# Altium integrated library My_Intlib.IntLib: 86 symbols
Pins are listed as number, name and electrical type; pins without a type are passive.

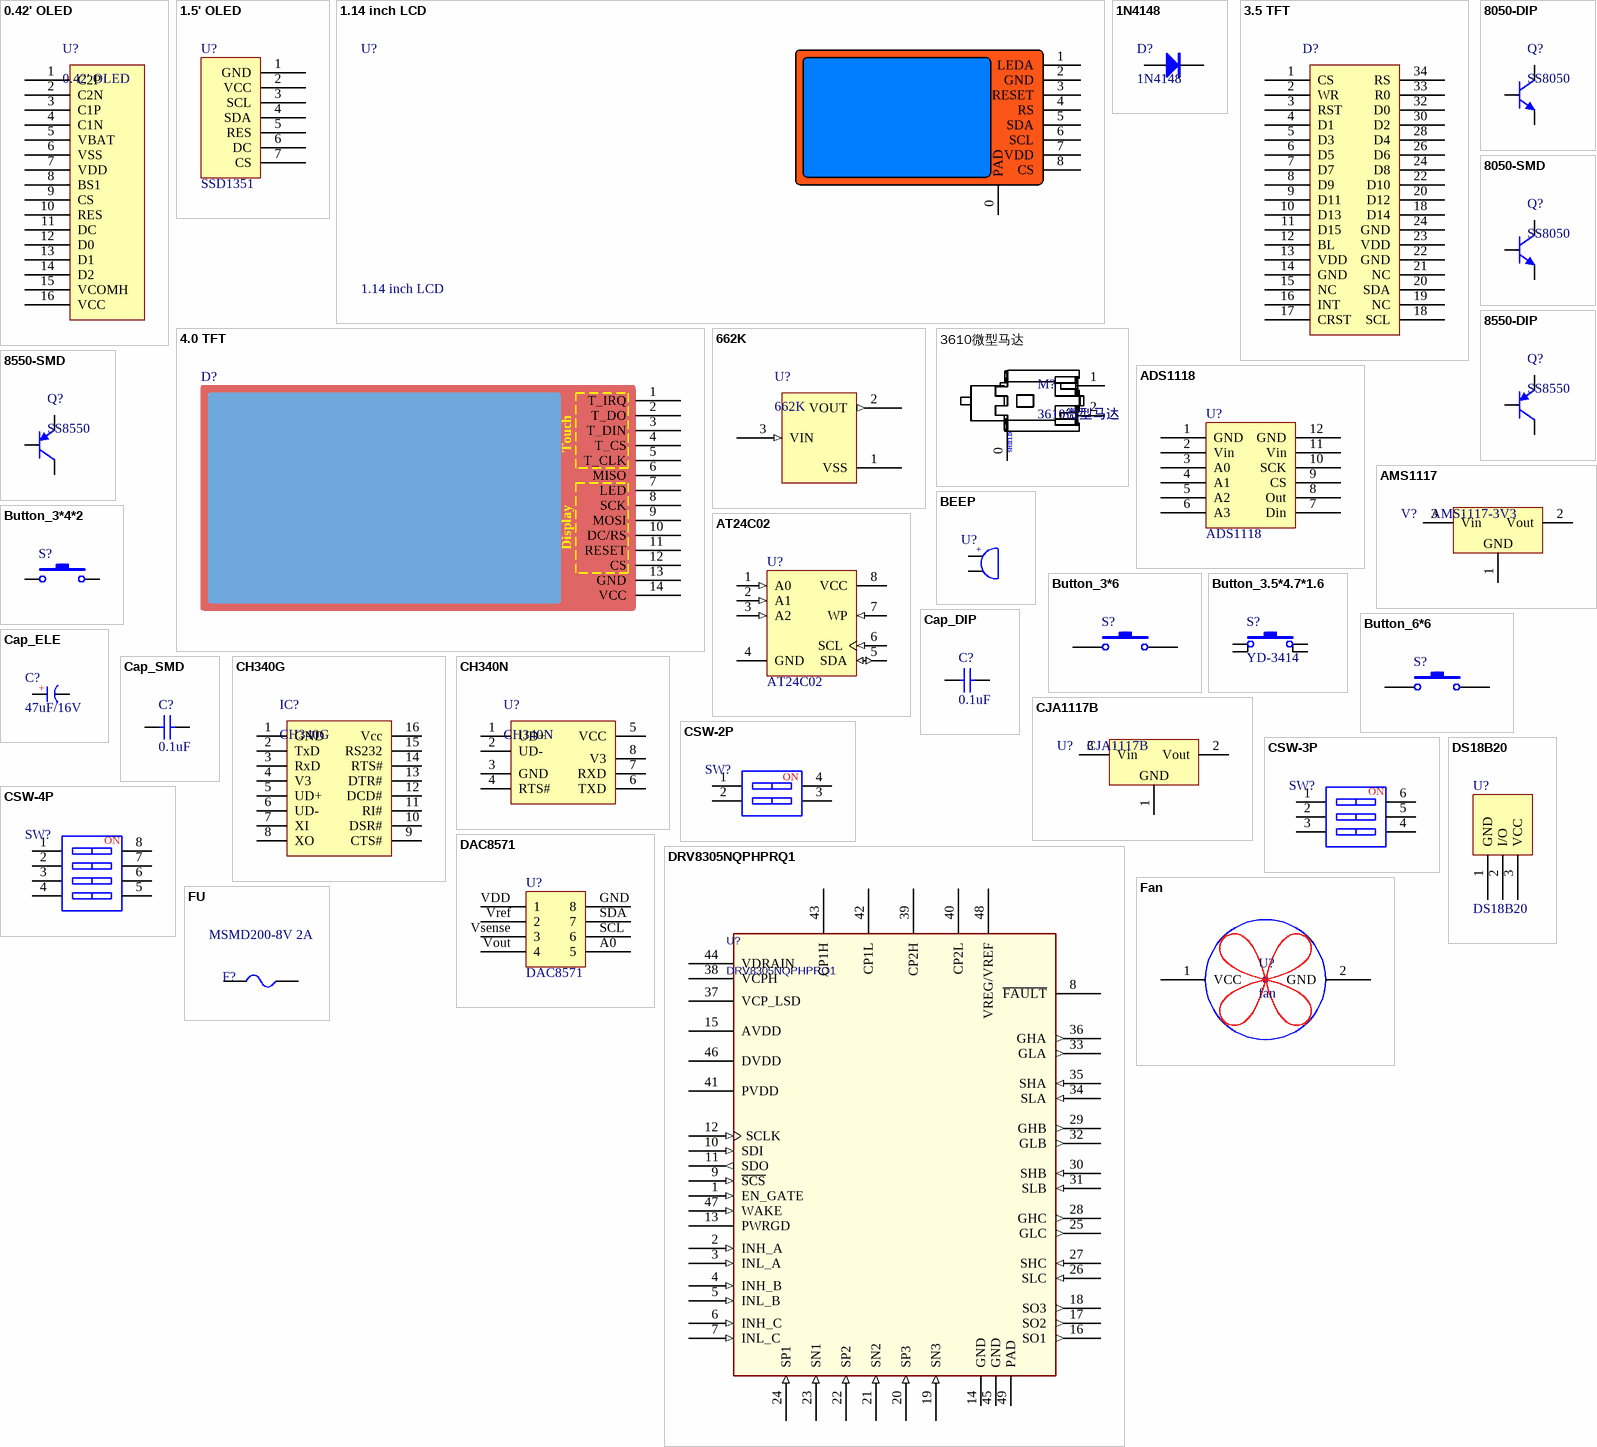
[diagram p0: symbols 0.42' OLED to FU]

## 0.42' OLED
designator U?
0.42寸OLED显示屏 / 驱动芯片SSD1306
footprint OLED 0.42'
pins: 1 C2P, 2 C2N, 3 C1P, 4 C1N, 5 VBAT, 6 VSS, 7 VDD, 8 BS1, 9 CS, 10 RES, 11 DC, 12 D0, 13 D1, 14 D2, 15 VCOMH, 16 VCC

## 1.5' OLED
designator U?, comment SSD1351
1.5寸彩色OLED，SSD1351
footprint OLED 1.3-12864_7pin (长：35.4mm，宽：33.5mm，)
pins: 1 GND, 2 VCC, 3 SCL, 4 SDA, 5 RES, 6 DC, 7 CS

## 1.14 inch LCD
designator U?
1.14寸lcd 液晶屏 显示屏tft lcd彩色液晶高清ips st7789 135x240
footprint 1.14_LCD
pins: 0 PAD, 1 LEDA, 2 GND, 3 RESET, 4 RS, 5 SDA, 6 SCL, 7 VDD, 8 CS

## 1N4148
designator D?
高速开关二极管; 版权归属: 源创客; BOM名称: 高速开关二极管; 学习资源: www.ooocke.com
footprint DO-35 (1.8*6.8mm(直径，脚距）)
footprint MINI_MELF (LL34) (1.5*3.4mm(直径，脚距）)
footprint SOD-323 (1.8x1.3X0.9mm（长宽高，不包括引脚）)
footprint DO-35V (1.8*2.5mm(直径，脚距）)
pins: 1 A, 2 K

## 3.5 TFT
designator D?  (value not drawn)
3.5寸电容触摸屏
pins: 1 CS, 2 WR, 3 RST, 4 D1, 5 D3, 6 D5, 7 D7, 8 D9, 9 D11, 10 D13, 11 D15, 12 BL, 13 VDD, 14 GND, 15 NC, 16 INT, 17 CRST, 18 D14, 18 SCL, 19 NC, 20 D12, 20 SDA, 21 NC, 22 D10, 22 GND, 23 VDD, 24 D8, 24 GND, 26 D6, 28 D4, 30 D2, 32 D0, 33 R0, 34 RS

## 4.0 TFT
designator D?
4.0寸TFT 彩色电阻屏 480*320
footprint 4.0 TFT
pins: 1 T_IRQ, 2 T_DO, 3 T_DIN, 4 T_CS, 5 T_CLK, 6 MISO, 7 LED, 8 SCK, 9 MOSI, 10 DC/RS, 11 RESET, 12 CS, 13 GND, 14 VCC
text: Touch; Display

## 662K
designator U?
线性LDO三极管稳压器芯片XC6206P332MR / 印字662K 封装SOT23
footprint SOT23-3N (3x1.3x1mm(长宽高))
pins: 1 VSS, 2 VOUT (out), 3 VIN (in)

## 3610微型马达
designator M?
3610微型马达，10.6mm*4.4mm*3.5mm，2.3~4.5V，85mA，12000RPM
footprint 3610微型马达 (3610微型马达，10.6mm*4.4mm*3.5mm)
pins: 0 SHIELD, 1, 2

## 8050-DIP
designator Q?, comment SS8050
高频放大-NPN型; 版权归属: 源创客; 属性: 40V 1.5A 1W 100MHZ; BOM名称: 高频放大-NPN型; 学习资源: www.ooocke.com
footprint TO92A (92晶体管)
footprint TO92B (92晶体管)
pins: 1 E, 2 B, 3 C

## 8050-SMD
designator Q?, comment SS8050
高频放大-NPN型; 版权归属: 源创客; 属性: 40V 1.5A 1W 100MHZ; BOM名称: 高频放大-NPN型; 学习资源: www.ooocke.com
footprint SOT23-3N (3x1.3x1mm(长宽高))
pins: 1 B, 2 E, 3 C

## 8550-DIP
designator Q?, comment SS8550
高频放大-PNP型; 版权归属: 源创客; 属性: 40V 1.5A 1W 100MHZ; BOM名称: 高频放大-PNP型; 学习资源: www.ooocke.com
footprint TO92A (92晶体管)
footprint TO92B (92晶体管)
pins: 1 E, 2 B, 3 C

## 8550-SMD
designator Q?, comment SS8550
高频放大-PNP型; 版权归属: 源创客; 属性: 40V 1.5A 1W 100MHZ; BOM名称: 高频放大-PNP型; 学习资源: www.ooocke.com
footprint SOT23-3N (3x1.3x1mm(长宽高))
pins: 1 B, 2 E, 3 C

## ADS1118
designator U?
16位ADC芯片
footprint ADS1118
pins: 1 GND, 2 Vin, 3 A0, 4 A1, 5 A2, 6 A3, 7 Din, 8 Out, 9 CS, 10 SCK, 11 Vin, 12 GND

## AMS1117
designator V?, comment AMS1117-3V3
三端稳压芯片; BOM名称: 稳压芯片; 版权归属: 源创客; 学习资源: www.ooocke.com
footprint SOT223 (6.4x7x1.6mm(长宽高))
pins: 1 GND, 2 Vout, 3 Vin

## AT24C02
designator U?
256KB，I2C通信; Published: 20-Sep-2010; DatasheetVersion: 8517C,  Jan-2009; PackageVersion: revC, Mar-2005; PackageReference: 8S1; Publisher: Altium Limited; PackageDescription: 8-Lead (0.150" Wide Body), Plastic Gull Wing Small Outline (JEDEC SOIC); Code_JEDEC: MS-012-AA; Code_IPC: SOIC127P600-8; ComponentLink1Description: Manufacturer Link; ComponentLink1URL: http://www.atmel.com/products/serial/default.asp; ComponentLink2Description: Datasheet; ComponentLink2URL: http://www.atmel.com/dyn/resources/prod_documents/doc8517.pdf; ComponentLink3Description: Atmel.com Home; ComponentLink3URL: http://www.atmel.com
footprint DIP8-300_MH (带底座 9.4*7.6*3.8(长宽高）)
footprint SOP8_N (5*6*1.8mm（长宽高）)
pins: 1 A0 (in), 2 A1 (in), 3 A2 (in), 4 GND (power), 5 SDA (io), 6 SCL (in), 7 WP (in), 8 VCC (power)

## BEEP
designator U?
蜂鸣器5020; BOM名称: 蜂鸣器; 版权归属: 源创客; 学习资源: www.ooocke.com
footprint Bee_5020
pins: 1, 2
text: +

## Button_3*4*2
designator S?
Published: 24-Mar-1999; LatestRevisionDate: 17-Jul-2002; LatestRevisionNote: Re-released for DXP Platform.; PackageReference: SPST-2; Publisher: Altium Limited
footprint TSW SMD-3*4*2
pins: 1, 2

## Button_3*6
designator S?
3mm*4mm*按钮长度待定; Published: 24-Mar-1999; LatestRevisionDate: 17-Jul-2002; LatestRevisionNote: Re-released for DXP Platform.; PackageReference: SPST-2; Publisher: Altium Limited
footprint TSW SMD-3*6*4.3
footprint TSW DIP-3*6*4.3_V (侧按轻触开关 3*6*4.3mm)
footprint TSW DIP-3*6*5 (3*6*5mm)
footprint TSW DIP-3*6*5_V (侧按轻触开关 3*6*5mm)
footprint TSW DIP-3*6*4.3 (3*6*4.3mm)
footprint TSW SMD-3*6*5 (3*6*5mm)
footprint TSW SMD-3*6*4.3_V (侧立贴片3*6*4.3)
pins: 1, 2

## Button_3.5*4.7*1.6
designator S?, comment YD-3414
中龟按键3.5*4.7*1.6; Published: 24-Mar-1999; LatestRevisionDate: 17-Jul-2002; LatestRevisionNote: Re-released for DXP Platform.; PackageReference: SPST-2; Publisher: Altium Limited
footprint YD3414 (中龟按键3.5*4.7*1.6)
pins: 1, 2, 3, 4

## Button_6*6
designator S?
6mm*6mm*按钮长度待定; Published: 24-Mar-1999; LatestRevisionDate: 17-Jul-2002; LatestRevisionNote: Re-released for DXP Platform.; PackageReference: SPST-2; Publisher: Altium Limited
footprint TSW DIP-6*6*4.3 (6*6*4.3mm)
footprint TSW DIP-6*6*4.3_V (侧按轻触开关 6*6*4.3mm)
footprint TSW DIP-6*6*5 (6*6*5mm)
footprint TSW DIP-6*6*5_V (侧按轻触开关 6*6*5mm)
footprint TSW DIP-6*6*6 (6*6*6mm)
footprint TSW DIP-6*6*6_V (侧按轻触开关 6*6*6mm)
footprint TSW DIP-6*6*7 (6*6*7mm)
footprint TSW DIP-6*6*7_V (侧按轻触开关 6*6*7mm)
footprint TSW SMD-6*6*4.3 (6*6*4.3mm)
footprint TSW SMD-6*6*5 (6*6*5mm)
footprint TSW SMD-6*6*6 (6*6*6mm)
footprint TSW SMD-6*6*7 (6*6*7mm)
pins: 1, 2

## Cap_DIP
designator C?, comment 0.1uF
直插电容; Value: 100nF; Voltage: 63V; Published: 8-Jun-2000; Revision: July-2002: Re-released for DXP Platform.; Publisher: Altium Limited; 实物样品照片: https://item.taobao.com/item.htm?spm=a230r.1.14.32.21fd24b7VWml4d&id=37914290992&ns=1&abbucket=13#detail
footprint 瓷片电容 (脚距2.2mm直径5mm)
pins: 1, 2

## Cap_ELE
designator C?, comment 47uF/16V
电解电容
footprint CM C(5*5.4) (贴片电解电容，直径5mm，高5.4mm)
pins: 1 A, 2 K
text: +

## Cap_SMD
designator C?, comment 0.1uF
贴片电容; Value: 100nF; Voltage: 63V; Published: 8-Jun-2000; Revision: July-2002: Re-released for DXP Platform.; Publisher: Altium Limited; 实物样品照片: https://item.taobao.com/item.htm?spm=a230r.1.14.32.21fd24b7VWml4d&id=37914290992&ns=1&abbucket=13#detail
footprint 0805_C
pins: 1, 2

## CH340G
designator IC?
串口转USB; 版权归属: 源创客; BOM名称: 串口转USB; 学习资源: www.ooocke.com
footprint SOP16_N (10.3*6.2*1.8mm（长宽高）)
pins: 1 GND, 2 TxD, 3 RxD, 4 V3, 5 UD+, 6 UD-, 7 XI, 8 XO, 9 CTS#, 10 DSR#, 11 RI#, 12 DCD#, 13 DTR#, 14 RTS#, 15 RS232, 16 Vcc

## CH340N
designator U?
串口转USB，内置时钟; BOM名称: 串口转USB; 版权归属: 源创客; 学习资源: www.ooocke.com
footprint SOP8_N (5*6*1.8mm（长宽高）)
pins: 1 UD+, 2 UD-, 3 GND, 4 RTS#, 5 VCC, 6 TXD, 7 RXD, 8 V3

## CJA1117B
designator U?
三端稳压芯片; BOM名称: 稳压芯片; 版权归属: 源创客; 学习资源: www.ooocke.com
footprint SOT89_N (CJA1117_4.6x4.3x1.6mm(长宽高))
pins: 1 GND, 2 Vout, 3 Vin

## CSW-2P
designator SW?  (value not drawn)
2路编码开关; 版权归属: 源创客; BOM名称: 2路编码开关; 学习资源: www.ooocke.com
footprint CSW DIP-2P (6.6*9.9*7mm)
footprint CSW DIP-2P_G (6.6*9.9*7mm)
footprint CSW1.27 SMD-2P (长：4.14mm，宽：5.4mm，高：2.3mm)
pins: 1, 2, 3, 4
text: ON

## CSW-3P
designator SW?  (value not drawn)
3路编码开关; 版权归属: 源创客; BOM名称: 3路编码开关; 学习资源: www.ooocke.com
footprint CSW DIP-3P (9.2*9.9*7mm)
footprint CSW DIP-3P_G (9.2*9.9*7mm)
footprint CSW1.27 SMD-3P (长：5.41mm，宽：5.4mm，高：2.3mm)
pins: 1, 2, 3, 4, 5, 6
text: ON

## CSW-4P
designator SW?  (value not drawn)
4路编码开关; 版权归属: 源创客; BOM名称: 4路编码开关; 学习资源: www.ooocke.com
footprint CSW DIP-4P (11.7*9.9*7mm)
footprint CSW DIP-4P_G (11.7*9.9*7mm)
footprint CSW1.27 SMD-4P (长：6.68mm，宽：5.4mm，高：2.3mm)
pins: 1, 2, 3, 4, 5, 6, 7, 8
text: ON

## DAC8571
designator U?
16位DAC芯片
footprint DIP8-300_MH (带底座 9.4*7.6*3.8(长宽高）); pin to pad A0>5 GND>8 SCL>6 SDA>7 VDD>1 Vout>4 Vref>2 Vsense>3
pins: A0 5, GND 8, SCL 6, SDA 7, VDD 1, Vout 4, Vref 2, Vsense 3

## DRV8305NQPHPRQ1
designator U?
TI的H桥有刷电机驱动 WQFN
footprint LQFP48-0R5-7X7-EP5X5 (TSQFP, 48-Leads, Body 7.00x7.00mm, Pitch 0.50mm, IPC Medium Density)
pins: 1 EN_GATE (in), 2 INH_A (in), 3 INL_A (in), 4 INH_B (in), 5 INL_B (in), 6 INH_C (in), 7 INL_C (in), 8 ~{FAULT} (oc), 9 ~{SCS} (in), 10 SDI (in), 11 SDO (out), 12 SCLK (in), 13 PWRGD (oc), 14 GND (power), 15 AVDD (power), 16 SO1 (out), 17 SO2 (out), 18 SO3 (out), 19 SN3 (in), 20 SP3 (in), 21 SN2 (in), 22 SP2 (in), 23 SN1 (in), 24 SP1 (in), 25 GLC (out), 26 SLC (in), 27 SHC (in), 28 GHC (out), 29 GHB (out), 30 SHB (in), 31 SLB (in), 32 GLB (out), 33 GLA (out), 34 SLA (in), 35 SHA (in), 36 GHA (out), 37 VCP_LSD, 38 VCPH, 39 CP2H, 40 CP2L, 41 PVDD (power), 42 CP1L, 43 CP1H, 44 VDRAIN (power), 45 GND (power), 46 DVDD (power), 47 WAKE (in), 48 VREG/VREF (power), 49 PAD (power)

## DS18B20
designator U?
数字型温度传感器
footprint HDR-1X3_Y (圆孔排母，3脚)
pins: 1 GND, 2 I/O, 3 VCC

## Fan
designator U?, comment fan
pins: 1 VCC, 2 GND

## FU
designator F?, comment MSMD200-8V 2A
贴片保险丝; 版权归属: 源创客; BOM名称: 贴片保险丝; 学习资源: www.ooocke.com
footprint FU 1210 (贴片保险丝)
pins: 1, 2

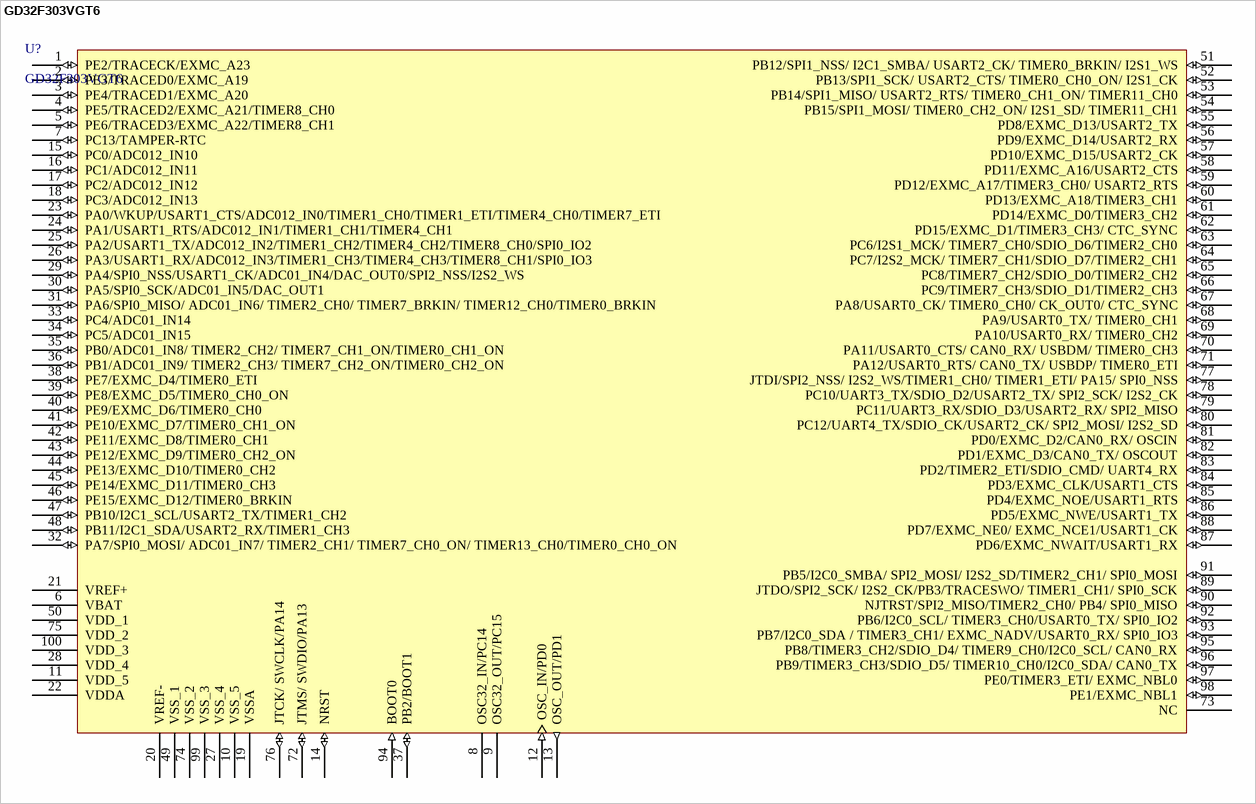
[diagram p1: symbol GD32F303VGT6]

## GD32F303VGT6
designator U?
【Package】：LQFP100     【Max Speed (MHz)】：120     【Flash (Bytes)】：1024K     【SRAM (Bytes)】：96K     【I/O】：up to 80 / 【GPTM (16bit)】：10     【Advanced TM (16bit)】：2     【Basic TM (16bit)】：2     【SysTick (24bit)】：1     【WDG】：2     【RTC】：1 / 【USART+UART】：3+2     【I2C】：2     【SPI】：3     【CAN 2.0B】：1    【USB 2.0】：1_FS     【I2S】：2 / 【SDIO】：1     【EXMC】：1     【12bit ADC Units (CHs)】：3(16)     【12bit DAC Units】：2
footprint LQFP100 14x14_N (100脚，体宽14x14mm，脚距0.5mm)
pins: 1 PE2/TRACECK/EXMC_A23 (io), 2 PE3/TRACED0/EXMC_A19 (io), 3 PE4/TRACED1/EXMC_A20 (io), 4 PE5/TRACED2/EXMC_A21/TIMER8_CH0 (io), 5 PE6/TRACED3/EXMC_A22/TIMER8_CH1 (io), 6 VBAT (power), 7 PC13/TAMPER-RTC (io), 8 OSC32_IN/PC14, 9 OSC32_OUT/PC15, 10 VSS_5 (power), 11 VDD_5 (power), 12 OSC_IN/PD0 (in), 13 OSC_OUT/PD1 (out), 14 NRST (io), 15 PC0/ADC012_IN10 (io), 16 PC1/ADC012_IN11 (io), 17 PC2/ADC012_IN12 (io), 18 PC3/ADC012_IN13 (io), 19 VSSA (power), 20 VREF- (power), 21 VREF+ (power), 22 VDDA (power), 23 PA0/WKUP/USART1_CTS/ADC012_IN0/TIMER1_CH0/TIMER1_ETI/TIMER4_CH0/TIMER7_ETI (io), 24 PA1/USART1_RTS/ADC012_IN1/TIMER1_CH1/TIMER4_CH1 (io), 25 PA2/USART1_TX/ADC012_IN2/TIMER1_CH2/TIMER4_CH2/TIMER8_CH0/SPI0_IO2 (io), 26 PA3/USART1_RX/ADC012_IN3/TIMER1_CH3/TIMER4_CH3/TIMER8_CH1/SPI0_IO3 (io), 27 VSS_4 (power), 28 VDD_4 (power), 29 PA4/SPI0_NSS/USART1_CK/ADC01_IN4/DAC_OUT0/SPI2_NSS/I2S2_WS (io), 30 PA5/SPI0_SCK/ADC01_IN5/DAC_OUT1 (io), 31 PA6/SPI0_MISO/ ADC01_IN6/ TIMER2_CH0/ TIMER7_BRKIN/ TIMER12_CH0/TIMER0_BRKIN (io), 32 PA7/SPI0_MOSI/ ADC01_IN7/ TIMER2_CH1/ TIMER7_CH0_ON/ TIMER13_CH0/TIMER0_CH0_ON (io), 33 PC4/ADC01_IN14 (io), 34 PC5/ADC01_IN15 (io), 35 PB0/ADC01_IN8/ TIMER2_CH2/ TIMER7_CH1_ON/TIMER0_CH1_ON (io), 36 PB1/ADC01_IN9/ TIMER2_CH3/ TIMER7_CH2_ON/TIMER0_CH2_ON (io), 37 PB2/BOOT1 (io), 38 PE7/EXMC_D4/TIMER0_ETI (io), 39 PE8/EXMC_D5/TIMER0_CH0_ON (io), 40 PE9/EXMC_D6/TIMER0_CH0 (io), 41 PE10/EXMC_D7/TIMER0_CH1_ON (io), 42 PE11/EXMC_D8/TIMER0_CH1 (io), 43 PE12/EXMC_D9/TIMER0_CH2_ON (io), 44 PE13/EXMC_D10/TIMER0_CH2 (io), 45 PE14/EXMC_D11/TIMER0_CH3 (io), 46 PE15/EXMC_D12/TIMER0_BRKIN (io), 47 PB10/I2C1_SCL/USART2_TX/TIMER1_CH2 (io), 48 PB11/I2C1_SDA/USART2_RX/TIMER1_CH3 (io), 49 VSS_1 (power), 50 VDD_1 (power), 51 PB12/SPI1_NSS/ I2C1_SMBA/ USART2_CK/ TIMER0_BRKIN/ I2S1_WS (io), 52 PB13/SPI1_SCK/ USART2_CTS/ TIMER0_CH0_ON/ I2S1_CK (io), 53 PB14/SPI1_MISO/ USART2_RTS/ TIMER0_CH1_ON/ TIMER11_CH0 (io), 54 PB15/SPI1_MOSI/ TIMER0_CH2_ON/ I2S1_SD/ TIMER11_CH1 (io), 55 PD8/EXMC_D13/USART2_TX (io), 56 PD9/EXMC_D14/USART2_RX (io), 57 PD10/EXMC_D15/USART2_CK (io), 58 PD11/EXMC_A16/USART2_CTS (io), 59 PD12/EXMC_A17/TIMER3_CH0/ USART2_RTS (io), 60 PD13/EXMC_A18/TIMER3_CH1 (io), 61 PD14/EXMC_D0/TIMER3_CH2 (io), 62 PD15/EXMC_D1/TIMER3_CH3/ CTC_SYNC (io), 63 PC6/I2S1_MCK/ TIMER7_CH0/SDIO_D6/TIMER2_CH0 (io), 64 PC7/I2S2_MCK/ TIMER7_CH1/SDIO_D7/TIMER2_CH1 (io), 65 PC8/TIMER7_CH2/SDIO_D0/TIMER2_CH2 (io), 66 PC9/TIMER7_CH3/SDIO_D1/TIMER2_CH3 (io), 67 PA8/USART0_CK/ TIMER0_CH0/ CK_OUT0/ CTC_SYNC (io), 68 PA9/USART0_TX/ TIMER0_CH1 (io), 69 PA10/USART0_RX/ TIMER0_CH2 (io), 70 PA11/USART0_CTS/ CAN0_RX/ USBDM/ TIMER0_CH3 (io), 71 PA12/USART0_RTS/ CAN0_TX/ USBDP/ TIMER0_ETI (io), 72 JTMS/ SWDIO/PA13 (io), 73 NC (hiz), 74 VSS_2 (power), 75 VDD_2 (power), 76 JTCK/ SWCLK/PA14 (io), 77 JTDI/SPI2_NSS/ I2S2_WS/TIMER1_CH0/ TIMER1_ETI/ PA15/ SPI0_NSS (io), 78 PC10/UART3_TX/SDIO_D2/USART2_TX/ SPI2_SCK/ I2S2_CK (io), 79 PC11/UART3_RX/SDIO_D3/USART2_RX/ SPI2_MISO (io), 80 PC12/UART4_TX/SDIO_CK/USART2_CK/ SPI2_MOSI/ I2S2_SD (io), 81 PD0/EXMC_D2/CAN0_RX/ OSCIN (io), 82 PD1/EXMC_D3/CAN0_TX/ OSCOUT (io), 83 PD2/TIMER2_ETI/SDIO_CMD/ UART4_RX (io), 84 PD3/EXMC_CLK/USART1_CTS (io), 85 PD4/EXMC_NOE/USART1_RTS (io), 86 PD5/EXMC_NWE/USART1_TX (io), 87 PD6/EXMC_NWAIT/USART1_RX (io), 88 PD7/EXMC_NE0/ EXMC_NCE1/USART1_CK (io), 89 JTDO/SPI2_SCK/ I2S2_CK/PB3/TRACESWO/ TIMER1_CH1/ SPI0_SCK (io), 90 NJTRST/SPI2_MISO/TIMER2_CH0/ PB4/ SPI0_MISO (io), 91 PB5/I2C0_SMBA/ SPI2_MOSI/ I2S2_SD/TIMER2_CH1/ SPI0_MOSI (io), 92 PB6/I2C0_SCL/ TIMER3_CH0/USART0_TX/ SPI0_IO2 (io), 93 PB7/I2C0_SDA / TIMER3_CH1/ EXMC_NADV/USART0_RX/ SPI0_IO3 (io), 94 BOOT0 (in), 95 PB8/TIMER3_CH2/SDIO_D4/ TIMER9_CH0/I2C0_SCL/ CAN0_RX (io), 96 PB9/TIMER3_CH3/SDIO_D5/ TIMER10_CH0/I2C0_SDA/ CAN0_TX (io), 97 PE0/TIMER3_ETI/ EXMC_NBL0 (io), 98 PE1/EXMC_NBL1 (io), 99 VSS_3 (power), 100 VDD_3 (power)

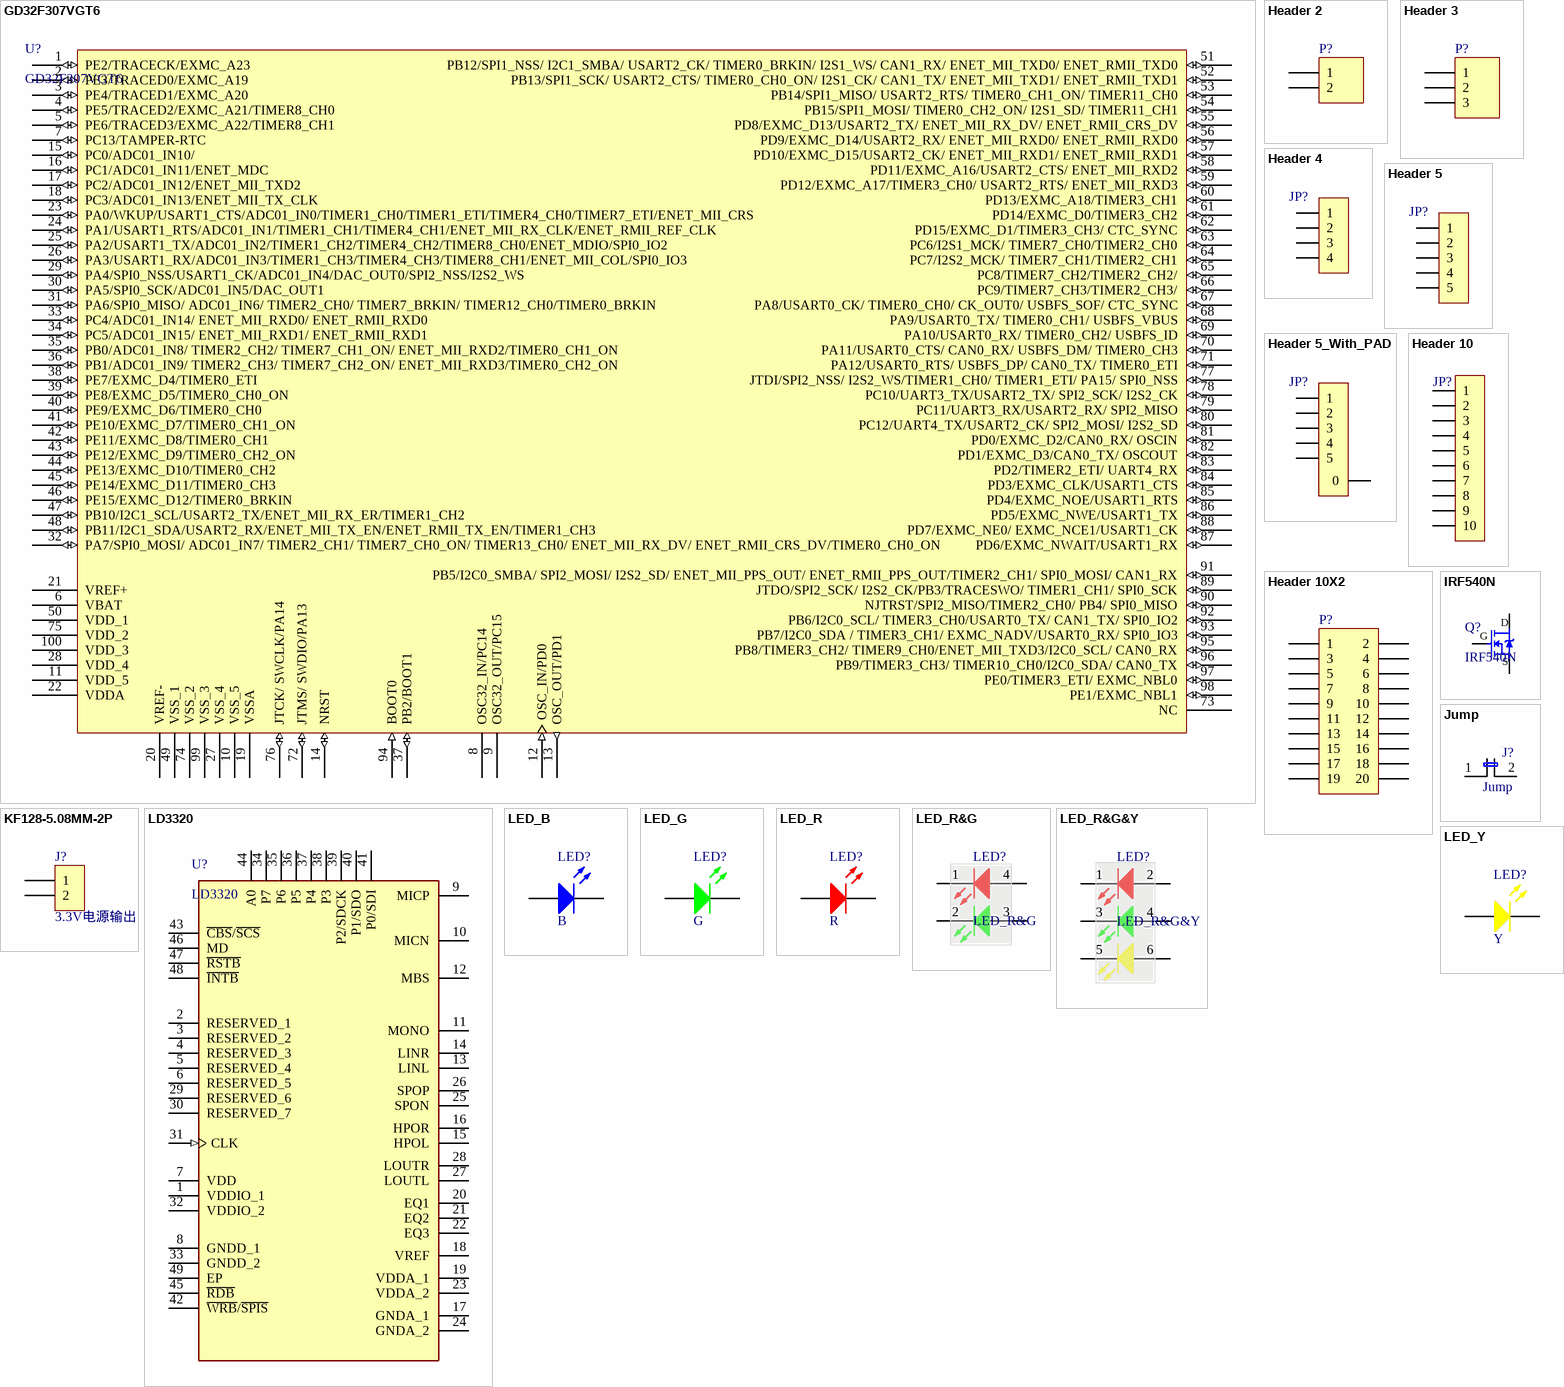
[diagram p2: symbols GD32F307VGT6 to LED_Y]

## GD32F307VGT6
designator U?
【Package】：LQFP100     【Max Speed (MHz)】：120     【Flash (Bytes)】：1024K     【SRAM (Bytes)】：96K     【I/O】：up to 80 / 【GPTM (16bit)】：10     【Advanced TM (16bit)】：2     【Basic TM (16bit)】：2     【SysTick (24bit)】：1     【WDG】：2     【RTC】：1 / 【USART+UART】：3+2     【I2C】：2     【SPI】：3     【CAN 2.0B】：2     【USB 2.0】：FS_OTG     【I2S】：2 / 【Ethernet】：1     【EXMC/SDRAM】：1/0     【12bit ADC Units (CHs)】：2(16)     【12bit DAC Units】：2
footprint LQFP100 14x14_N (100脚，体宽14x14mm，脚距0.5mm)
pins: 1 PE2/TRACECK/EXMC_A23 (io), 2 PE3/TRACED0/EXMC_A19 (io), 3 PE4/TRACED1/EXMC_A20 (io), 4 PE5/TRACED2/EXMC_A21/TIMER8_CH0 (io), 5 PE6/TRACED3/EXMC_A22/TIMER8_CH1 (io), 6 VBAT (power), 7 PC13/TAMPER-RTC (io), 8 OSC32_IN/PC14, 9 OSC32_OUT/PC15, 10 VSS_5 (power), 11 VDD_5 (power), 12 OSC_IN/PD0 (in), 13 OSC_OUT/PD1 (out), 14 NRST (io), 15 PC0/ADC01_IN10/ (io), 16 PC1/ADC01_IN11/ENET_MDC (io), 17 PC2/ADC01_IN12/ENET_MII_TXD2 (io), 18 PC3/ADC01_IN13/ENET_MII_TX_CLK (io), 19 VSSA (power), 20 VREF- (power), 21 VREF+ (power), 22 VDDA (power), 23 PA0/WKUP/USART1_CTS/ADC01_IN0/TIMER1_CH0/TIMER1_ETI/TIMER4_CH0/TIMER7_ETI/ENET_MII_CRS (io), 24 PA1/USART1_RTS/ADC01_IN1/TIMER1_CH1/TIMER4_CH1/ENET_MII_RX_CLK/ENET_RMII_REF_CLK (io), 25 PA2/USART1_TX/ADC01_IN2/TIMER1_CH2/TIMER4_CH2/TIMER8_CH0/ENET_MDIO/SPI0_IO2 (io), 26 PA3/USART1_RX/ADC01_IN3/TIMER1_CH3/TIMER4_CH3/TIMER8_CH1/ENET_MII_COL/SPI0_IO3 (io), 27 VSS_4 (power), 28 VDD_4 (power), 29 PA4/SPI0_NSS/USART1_CK/ADC01_IN4/DAC_OUT0/SPI2_NSS/I2S2_WS (io), 30 PA5/SPI0_SCK/ADC01_IN5/DAC_OUT1 (io), 31 PA6/SPI0_MISO/ ADC01_IN6/ TIMER2_CH0/ TIMER7_BRKIN/ TIMER12_CH0/TIMER0_BRKIN (io), 32 PA7/SPI0_MOSI/ ADC01_IN7/ TIMER2_CH1/ TIMER7_CH0_ON/ TIMER13_CH0/ ENET_MII_RX_DV/ ENET_RMII_CRS_DV/TIMER0_CH0_ON (io), 33 PC4/ADC01_IN14/ ENET_MII_RXD0/ ENET_RMII_RXD0 (io), 34 PC5/ADC01_IN15/ ENET_MII_RXD1/ ENET_RMII_RXD1 (io), 35 PB0/ADC01_IN8/ TIMER2_CH2/ TIMER7_CH1_ON/ ENET_MII_RXD2/TIMER0_CH1_ON (io), 36 PB1/ADC01_IN9/ TIMER2_CH3/ TIMER7_CH2_ON/ ENET_MII_RXD3/TIMER0_CH2_ON (io), 37 PB2/BOOT1 (io), 38 PE7/EXMC_D4/TIMER0_ETI (io), 39 PE8/EXMC_D5/TIMER0_CH0_ON (io), 40 PE9/EXMC_D6/TIMER0_CH0 (io), 41 PE10/EXMC_D7/TIMER0_CH1_ON (io), 42 PE11/EXMC_D8/TIMER0_CH1 (io), 43 PE12/EXMC_D9/TIMER0_CH2_ON (io), 44 PE13/EXMC_D10/TIMER0_CH2 (io), 45 PE14/EXMC_D11/TIMER0_CH3 (io), 46 PE15/EXMC_D12/TIMER0_BRKIN (io), 47 PB10/I2C1_SCL/USART2_TX/ENET_MII_RX_ER/TIMER1_CH2 (io), 48 PB11/I2C1_SDA/USART2_RX/ENET_MII_TX_EN/ENET_RMII_TX_EN/TIMER1_CH3 (io), 49 VSS_1 (power), 50 VDD_1 (power), 51 PB12/SPI1_NSS/ I2C1_SMBA/ USART2_CK/ TIMER0_BRKIN/ I2S1_WS/ CAN1_RX/ ENET_MII_TXD0/ ENET_RMII_TXD0 (io), 52 PB13/SPI1_SCK/ USART2_CTS/ TIMER0_CH0_ON/ I2S1_CK/ CAN1_TX/ ENET_MII_TXD1/ ENET_RMII_TXD1 (io), 53 PB14/SPI1_MISO/ USART2_RTS/ TIMER0_CH1_ON/ TIMER11_CH0 (io), 54 PB15/SPI1_MOSI/ TIMER0_CH2_ON/ I2S1_SD/ TIMER11_CH1 (io), 55 PD8/EXMC_D13/USART2_TX/ ENET_MII_RX_DV/ ENET_RMII_CRS_DV (io), 56 PD9/EXMC_D14/USART2_RX/ ENET_MII_RXD0/ ENET_RMII_RXD0 (io), 57 PD10/EXMC_D15/USART2_CK/ ENET_MII_RXD1/ ENET_RMII_RXD1 (io), 58 PD11/EXMC_A16/USART2_CTS/ ENET_MII_RXD2 (io), 59 PD12/EXMC_A17/TIMER3_CH0/ USART2_RTS/ ENET_MII_RXD3 (io), 60 PD13/EXMC_A18/TIMER3_CH1 (io), 61 PD14/EXMC_D0/TIMER3_CH2 (io), 62 PD15/EXMC_D1/TIMER3_CH3/ CTC_SYNC (io), 63 PC6/I2S1_MCK/ TIMER7_CH0/TIMER2_CH0 (io), 64 PC7/I2S2_MCK/ TIMER7_CH1/TIMER2_CH1 (io), 65 PC8/TIMER7_CH2/TIMER2_CH2/ (io), 66 PC9/TIMER7_CH3/TIMER2_CH3/ (io), 67 PA8/USART0_CK/ TIMER0_CH0/ CK_OUT0/ USBFS_SOF/ CTC_SYNC (io), 68 PA9/USART0_TX/ TIMER0_CH1/ USBFS_VBUS (io), 69 PA10/USART0_RX/ TIMER0_CH2/ USBFS_ID (io), 70 PA11/USART0_CTS/ CAN0_RX/ USBFS_DM/ TIMER0_CH3 (io), 71 PA12/USART0_RTS/ USBFS_DP/ CAN0_TX/ TIMER0_ETI (io), 72 JTMS/ SWDIO/PA13 (io), 73 NC (hiz), 74 VSS_2 (power), 75 VDD_2 (power), 76 JTCK/ SWCLK/PA14 (io), 77 JTDI/SPI2_NSS/ I2S2_WS/TIMER1_CH0/ TIMER1_ETI/ PA15/ SPI0_NSS (io), 78 PC10/UART3_TX/USART2_TX/ SPI2_SCK/ I2S2_CK (io), 79 PC11/UART3_RX/USART2_RX/ SPI2_MISO (io), 80 PC12/UART4_TX/USART2_CK/ SPI2_MOSI/ I2S2_SD (io), 81 PD0/EXMC_D2/CAN0_RX/ OSCIN (io), 82 PD1/EXMC_D3/CAN0_TX/ OSCOUT (io), 83 PD2/TIMER2_ETI/ UART4_RX (io), 84 PD3/EXMC_CLK/USART1_CTS (io), 85 PD4/EXMC_NOE/USART1_RTS (io), 86 PD5/EXMC_NWE/USART1_TX (io), 87 PD6/EXMC_NWAIT/USART1_RX (io), 88 PD7/EXMC_NE0/ EXMC_NCE1/USART1_CK (io), 89 JTDO/SPI2_SCK/ I2S2_CK/PB3/TRACESWO/ TIMER1_CH1/ SPI0_SCK (io), 90 NJTRST/SPI2_MISO/TIMER2_CH0/ PB4/ SPI0_MISO (io), 91 PB5/I2C0_SMBA/ SPI2_MOSI/ I2S2_SD/ ENET_MII_PPS_OUT/ ENET_RMII_PPS_OUT/TIMER2_CH1/ SPI0_MOSI/ CAN1_RX (io), 92 PB6/I2C0_SCL/ TIMER3_CH0/USART0_TX/ CAN1_TX/ SPI0_IO2 (io), 93 PB7/I2C0_SDA / TIMER3_CH1/ EXMC_NADV/USART0_RX/ SPI0_IO3 (io), 94 BOOT0 (in), 95 PB8/TIMER3_CH2/ TIMER9_CH0/ENET_MII_TXD3/I2C0_SCL/ CAN0_RX (io), 96 PB9/TIMER3_CH3/ TIMER10_CH0/I2C0_SDA/ CAN0_TX (io), 97 PE0/TIMER3_ETI/ EXMC_NBL0 (io), 98 PE1/EXMC_NBL1 (io), 99 VSS_3 (power), 100 VDD_3 (power)

## Header 2
designator P?
2P接插件; LatestRevisionDate: 17-Jul-2002; LatestRevisionNote: Re-released for DXP Platform.; Publisher: Altium Limited
footprint HDR-1X2_H (弯脚排针，2脚)
footprint HDR-1x2 (排针，2脚)
footprint HDR-1X2_M (排母，2脚)
footprint HDR-1X2_Y (圆孔排母，2脚)
footprint KF128-5.08-2P (螺钉式接线端子，脚距5.08mm)
footprint KF2EDGK5.08-LI-2P (立插端子)
footprint KF2EDGK5.08-WI-2P (卧插端子)
footprint XH2.54-2P
footprint XH2.54-WS-2P (长：10mm，宽：8mm，高：6.1mm)
pins: 1, 2

## Header 3
designator P?
3P接插件; LatestRevisionDate: 17-Jul-2002; LatestRevisionNote: Re-released for DXP Platform.; Publisher: Altium Limited
footprint HDR1X3 (Connector; Header; 3 Position)
footprint HDR-1X3_M (排母，3脚)
footprint HDR-1X3_H (弯脚排针，3脚)
footprint HDR-1X3_Y (圆孔排母，3脚)
pins: 1, 2, 3

## Header 4
designator JP?, comment HDR-1X4  (value not drawn)
4P接插件; 版权归属: 源创客; BOM名称: 4P接插件; 学习资源: www.ooocke.com
footprint XH2.54-WI-4P (接插件，4P)
footprint XH2.54-LI-4P (接插件，4P)
footprint HDR2.54-LI-4P (Footprint not found)
footprint HDR2.54-M-LI-4P (排母，4脚)
footprint HDR2.54-WI-4P (弯脚排针，4脚)
footprint HDR2.54-Y-LI-4P (圆孔排母，4脚)
footprint HDR2.54-M-WS-4P (4P卧式贴片排母2.54)
footprint XH2.54-WS-4P (长：15mm，宽：8mm，高：6.1mm)
pins: 1, 2, 3, 4

## Header 5
designator JP?, comment HDR-1X5  (value not drawn)
5P接插件; 版权归属: 源创客; BOM名称: 5P接插件; 学习资源: www.ooocke.com
footprint XH2.54-WI-5P (接插件，5P)
footprint XH2.54-LI-5P (接插件，5P)
footprint HDR2.54-LI-5P (排针，5脚)
footprint HDR2.54-M-LI-5P (排母，5脚)
footprint HDR2.54-WI-5P (弯脚排针，5脚)
footprint HDR2.54-WS-5P (5P卧式贴片排针2.54)
footprint HDR2.54-Y-LI-5P (圆孔排母，5脚)
footprint HDR2.54-M-WS-5P (5P卧式贴片排母2.54)
footprint KF2510-LI-5P (接插件/2A)
footprint XH2.54-WS-5P (长：17.5mm，宽：8mm，高：6.1mm)
footprint XH2.54-LS-5P (长：17.5mm，宽：6mm，高：8.3mm)
footprint KF2EDGK-2.54-LI-5P (长：14.6mm，宽：8.1mm，高：10.1mm)
footprint KF2EDGK-2.54-WI-5P (长：14.6mm，宽：10.1mm，高：8.1mm)
pins: 1, 2, 3, 4, 5

## Header 5_With_PAD
designator JP?, comment HDR-1X5  (value not drawn)
5P接插件; 版权归属: 源创客; BOM名称: 5P接插件; 学习资源: www.ooocke.com
footprint PH2.0-WS-5P (长：14mm，宽：7.6mm，高：5.5mm)
pins: 0, 1, 2, 3, 4, 5
